# Altium schematic symbol library jlcpcb_2025_04_ferrites_extended_0603.schlib: 833 symbols (part 4 of 4) (continued)
## SZ1608K221TF
designator FB?  Impedance @ Frequency: 220Ω@100MHz
Ferrite, 220Ω@100MHz, ±25%, 450mΩ, 500mA, SMD 0603; Manufacturer: Sunlord; Manufacturer Part Number: SZ1608K221TF; Package Size: 0603; JLCPCB Basic Part: No; JLCPCB Part Number: C96988; Supplier 1: LCSC; Category: Ferrite Beads; Supplier Part Number 1: C96988; Tolerance: ±25%; Rated Current: 500mA; DC Resistance: 450mΩ; RoHS: Yes; ComponentLink1Description: Datasheet; ComponentLink1URL: https://wmsc.lcsc.com/wmsc/upload/file/pdf/v2/lcsc/2310301641_Sunlord-SZ1608K221TF_C96988.pdf; ComponentLink2Description: JLCPCB Part URL; ComponentLink2URL: https://jlcpcb.com/partdetail/C96988; ComponentLink3Description: LCSC Part URL; ComponentLink3URL: https://lcsc.com/product-detail/Ferrite-Beads_Sunlord-Sunlord-SZ1608K221TF_C96988.html
footprint FB-0603 (0603 (1608M) Ferrite)
pins: 1, 2

## SZ1608K222TF
designator FB?  Impedance @ Frequency: 2.2kΩ@100MHz
Ferrite, 2.2kΩ@100MHz, ±25%, 1Ω, 200mA, SMD 0603; Manufacturer: Sunlord; Manufacturer Part Number: SZ1608K222TF; Package Size: 0603; JLCPCB Basic Part: No; JLCPCB Part Number: C370562; Supplier 1: LCSC; Category: Ferrite Beads; Supplier Part Number 1: C370562; Tolerance: ±25%; Rated Current: 200mA; DC Resistance: 1Ω; RoHS: Yes; ComponentLink1Description: Datasheet; ComponentLink1URL: https://wmsc.lcsc.com/wmsc/upload/file/pdf/v2/lcsc/2310301641_Sunlord-SZ1608K222TF_C370562.pdf; ComponentLink2Description: JLCPCB Part URL; ComponentLink2URL: https://jlcpcb.com/partdetail/C370562; ComponentLink3Description: LCSC Part URL; ComponentLink3URL: https://lcsc.com/product-detail/Ferrite-Beads_Sunlord-Sunlord-SZ1608K222TF_C370562.html
footprint FB-0603 (0603 (1608M) Ferrite)
pins: 1, 2

## SZ1608K252CTF
designator FB?  Impedance @ Frequency: 2.5kΩ@100MHz
Ferrite, 2.5kΩ@100MHz, ±25%, 1.2Ω, SMD 0603; Manufacturer: Sunlord; Manufacturer Part Number: SZ1608K252CTF; Package Size: 0603; JLCPCB Basic Part: No; JLCPCB Part Number: C316340; Supplier 1: LCSC; Category: Ferrite Beads; Supplier Part Number 1: C316340; Tolerance: ±25%; DC Resistance: 1.2Ω; RoHS: Yes; ComponentLink1Description: Datasheet; ComponentLink1URL: https://wmsc.lcsc.com/wmsc/upload/file/pdf/v2/lcsc/2310301641_Sunlord-SZ1608K252CTF_C316340.pdf; ComponentLink2Description: JLCPCB Part URL; ComponentLink2URL: https://jlcpcb.com/partdetail/C316340; ComponentLink3Description: LCSC Part URL; ComponentLink3URL: https://lcsc.com/product-detail/Ferrite-Beads_Sunlord-Sunlord-SZ1608K252CTF_C316340.html
pins: 1, 2

## SZ1608K252TF
designator FB?  Impedance @ Frequency: 2.5kΩ@100MHz
Ferrite, 2.5kΩ@100MHz, ±25%, 1.2Ω, 200mA, SMD 0603; Manufacturer: Sunlord; Manufacturer Part Number: SZ1608K252TF; Package Size: 0603; JLCPCB Basic Part: No; JLCPCB Part Number: C96989; Supplier 1: LCSC; Category: Ferrite Beads; Supplier Part Number 1: C96989; Tolerance: ±25%; Rated Current: 200mA; DC Resistance: 1.2Ω; RoHS: Yes; ComponentLink1Description: Datasheet; ComponentLink1URL: https://wmsc.lcsc.com/wmsc/upload/file/pdf/v2/lcsc/2310301641_Sunlord-SZ1608K252TF_C96989.pdf; ComponentLink2Description: JLCPCB Part URL; ComponentLink2URL: https://jlcpcb.com/partdetail/C96989; ComponentLink3Description: LCSC Part URL; ComponentLink3URL: https://lcsc.com/product-detail/Ferrite-Beads_Sunlord-Sunlord-SZ1608K252TF_C96989.html
footprint FB-0603 (0603 (1608M) Ferrite)
pins: 1, 2

## SZ1608K272TF
designator FB?  Impedance @ Frequency: 2.7kΩ@100MHz
Ferrite, 2.7kΩ@100MHz, ±25%, 1.4Ω, 200mA, SMD 0603; Manufacturer: Sunlord; Manufacturer Part Number: SZ1608K272TF; Package Size: 0603; JLCPCB Basic Part: No; JLCPCB Part Number: C370563; Supplier 1: LCSC; Category: Ferrite Beads; Supplier Part Number 1: C370563; Tolerance: ±25%; Rated Current: 200mA; DC Resistance: 1.4Ω; RoHS: Yes; ComponentLink1Description: Datasheet; ComponentLink1URL: https://wmsc.lcsc.com/wmsc/upload/file/pdf/v2/lcsc/2310301641_Sunlord-SZ1608K272TF_C370563.pdf; ComponentLink2Description: JLCPCB Part URL; ComponentLink2URL: https://jlcpcb.com/partdetail/C370563; ComponentLink3Description: LCSC Part URL; ComponentLink3URL: https://lcsc.com/product-detail/Ferrite-Beads_Sunlord-Sunlord-SZ1608K272TF_C370563.html
footprint FB-0603 (0603 (1608M) Ferrite)
pins: 1, 2

## SZ1608K331TF
designator FB?  Impedance @ Frequency: 330Ω@100MHz
Ferrite, 330Ω@100MHz, ±25%, 500mΩ, 500mA, SMD 0603; Manufacturer: Sunlord; Manufacturer Part Number: SZ1608K331TF; Package Size: 0603; JLCPCB Basic Part: No; JLCPCB Part Number: C96990; Supplier 1: LCSC; Category: Ferrite Beads; Supplier Part Number 1: C96990; Tolerance: ±25%; Rated Current: 500mA; DC Resistance: 500mΩ; RoHS: Yes; ComponentLink1Description: Datasheet; ComponentLink1URL: https://wmsc.lcsc.com/wmsc/upload/file/pdf/v2/lcsc/2310301641_Sunlord-SZ1608K331TF_C96990.pdf; ComponentLink2Description: JLCPCB Part URL; ComponentLink2URL: https://jlcpcb.com/partdetail/C96990; ComponentLink3Description: LCSC Part URL; ComponentLink3URL: https://lcsc.com/product-detail/Ferrite-Beads_Sunlord-Sunlord-SZ1608K331TF_C96990.html
footprint FB-0603 (0603 (1608M) Ferrite)
pins: 1, 2

## SZ1608K421TF
designator FB?  Impedance @ Frequency: 420Ω@100MHz
Ferrite, 420Ω@100MHz, ±25%, 550mΩ, 400mA, SMD 0603; Manufacturer: Sunlord; Manufacturer Part Number: SZ1608K421TF; Package Size: 0603; JLCPCB Basic Part: No; JLCPCB Part Number: C370564; Supplier 1: LCSC; Category: Ferrite Beads; Supplier Part Number 1: C370564; Tolerance: ±25%; Rated Current: 400mA; DC Resistance: 550mΩ; RoHS: Yes; ComponentLink1Description: Datasheet; ComponentLink1URL: https://wmsc.lcsc.com/wmsc/upload/file/pdf/v2/lcsc/2310301641_Sunlord-SZ1608K421TF_C370564.pdf; ComponentLink2Description: JLCPCB Part URL; ComponentLink2URL: https://jlcpcb.com/partdetail/C370564; ComponentLink3Description: LCSC Part URL; ComponentLink3URL: https://lcsc.com/product-detail/Ferrite-Beads_Sunlord-Sunlord-SZ1608K421TF_C370564.html
footprint FB-0603 (0603 (1608M) Ferrite)
pins: 1, 2

## SZ1608K601CTF
designator FB?  Impedance @ Frequency: 600Ω@100MHz
Ferrite, 600Ω@100MHz, ±25%, 600mΩ, SMD 0603; Manufacturer: Sunlord; Manufacturer Part Number: SZ1608K601CTF; Package Size: 0603; JLCPCB Basic Part: No; JLCPCB Part Number: C316339; Supplier 1: LCSC; Category: Ferrite Beads; Supplier Part Number 1: C316339; Tolerance: ±25%; DC Resistance: 600mΩ; RoHS: Yes; ComponentLink1Description: Datasheet; ComponentLink1URL: https://wmsc.lcsc.com/wmsc/upload/file/pdf/v2/lcsc/2310301641_Sunlord-SZ1608K601CTF_C316339.pdf; ComponentLink2Description: JLCPCB Part URL; ComponentLink2URL: https://jlcpcb.com/partdetail/C316339; ComponentLink3Description: LCSC Part URL; ComponentLink3URL: https://lcsc.com/product-detail/Ferrite-Beads_Sunlord-Sunlord-SZ1608K601CTF_C316339.html
pins: 1, 2

## SZ1608K601TF
designator FB?  Impedance @ Frequency: 600Ω@100MHz
Ferrite, 600Ω@100MHz, ±25%, 600mΩ, 200mA, SMD 0603; Manufacturer: Sunlord; Manufacturer Part Number: SZ1608K601TF; Package Size: 0603; JLCPCB Basic Part: No; JLCPCB Part Number: C96991; Supplier 1: LCSC; Category: Ferrite Beads; Supplier Part Number 1: C96991; Tolerance: ±25%; Rated Current: 200mA; DC Resistance: 600mΩ; RoHS: Yes; ComponentLink1Description: Datasheet; ComponentLink1URL: https://wmsc.lcsc.com/wmsc/upload/file/pdf/v2/lcsc/2310301641_Sunlord-SZ1608K601TF_C96991.pdf; ComponentLink2Description: JLCPCB Part URL; ComponentLink2URL: https://jlcpcb.com/partdetail/C96991; ComponentLink3Description: LCSC Part URL; ComponentLink3URL: https://lcsc.com/product-detail/Ferrite-Beads_Sunlord-Sunlord-SZ1608K601TF_C96991.html
footprint FB-0603 (0603 (1608M) Ferrite)
pins: 1, 2

## UPB160805T-121Y-N
designator FB?  Impedance @ Frequency: 120Ω@100MHz
Ferrite, 120Ω@100MHz, ±25%, 0.025Ω, 3000mA, SMD 0603; Manufacturer: Chilisin Elec; Manufacturer Part Number: UPB160805T-121Y-N; Package Size: 0603; JLCPCB Basic Part: No; JLCPCB Part Number: C285595; Supplier 1: LCSC; Category: Ferrite Beads; Supplier Part Number 1: C285595; Tolerance: ±25%; Rated Current: 3000mA; DC Resistance: 0.025Ω; RoHS: Yes; ComponentLink1Description: Datasheet; ComponentLink1URL: https://wmsc.lcsc.com/wmsc/upload/file/pdf/v2/lcsc/1810311831_Chilisin-Elec-UPB160805T-121Y-N_C285595.pdf; ComponentLink2Description: JLCPCB Part URL; ComponentLink2URL: https://jlcpcb.com/partdetail/C285595; ComponentLink3Description: LCSC Part URL; ComponentLink3URL: https://lcsc.com/product-detail/Ferrite-Beads_Chilisin-Elec-Chilisin-Elec-UPB160805T-121Y-N_C285595.html
footprint FB-0603 (0603 (1608M) Ferrite)
pins: 1, 2

## UPB160805T-260Y-N
designator FB?  Impedance @ Frequency: 26Ω@100MHz
Ferrite, 26Ω@100MHz, ±25%, 0.007Ω, 6000mA, SMD 0603; Manufacturer: Chilisin Elec; Manufacturer Part Number: UPB160805T-260Y-N; Package Size: 0603; JLCPCB Basic Part: No; JLCPCB Part Number: C285594; Supplier 1: LCSC; Category: Ferrite Beads; Supplier Part Number 1: C285594; Tolerance: ±25%; Rated Current: 6000mA; DC Resistance: 0.007Ω; RoHS: Yes; ComponentLink1Description: Datasheet; ComponentLink1URL: https://wmsc.lcsc.com/wmsc/upload/file/pdf/v2/lcsc/2304140030_Chilisin-Elec-UPB160805T-260Y-N_C285594.pdf; ComponentLink2Description: JLCPCB Part URL; ComponentLink2URL: https://jlcpcb.com/partdetail/C285594; ComponentLink3Description: LCSC Part URL; ComponentLink3URL: https://lcsc.com/product-detail/Ferrite-Beads_Chilisin-Elec-Chilisin-Elec-UPB160805T-260Y-N_C285594.html
footprint FB-0603 (0603 (1608M) Ferrite)
pins: 1, 2

## UPB160808T-121Y-N
designator FB?  Impedance @ Frequency: 120Ω@100MHz
Ferrite, 120Ω@100MHz, ±25%, 0.03Ω, 3000mA, SMD 0603; Manufacturer: Chilisin Elec; Manufacturer Part Number: UPB160808T-121Y-N; Package Size: 0603; JLCPCB Basic Part: No; JLCPCB Part Number: C280697; Supplier 1: LCSC; Category: Ferrite Beads; Supplier Part Number 1: C280697; Tolerance: ±25%; Rated Current: 3000mA; DC Resistance: 0.03Ω; RoHS: Yes; ComponentLink1Description: Datasheet; ComponentLink1URL: https://wmsc.lcsc.com/wmsc/upload/file/pdf/v2/lcsc/2304140030_Chilisin-Elec-UPB160808T-121Y-N_C280697.pdf; ComponentLink2Description: JLCPCB Part URL; ComponentLink2URL: https://jlcpcb.com/partdetail/C280697; ComponentLink3Description: LCSC Part URL; ComponentLink3URL: https://lcsc.com/product-detail/Ferrite-Beads_Chilisin-Elec-Chilisin-Elec-UPB160808T-121Y-N_C280697.html
footprint FB-0603 (0603 (1608M) Ferrite)
pins: 1, 2

## UPB160808T-221Y-N
designator FB?  Impedance @ Frequency: 220Ω@100MHz
Ferrite, 220Ω@100MHz, ±25%, 0.04Ω, 2500mA, SMD 0603; Manufacturer: Chilisin Elec; Manufacturer Part Number: UPB160808T-221Y-N; Package Size: 0603; JLCPCB Basic Part: No; JLCPCB Part Number: C280698; Supplier 1: LCSC; Category: Ferrite Beads; Supplier Part Number 1: C280698; Tolerance: ±25%; Rated Current: 2500mA; DC Resistance: 0.04Ω; RoHS: Yes; ComponentLink1Description: Datasheet; ComponentLink1URL: https://wmsc.lcsc.com/wmsc/upload/file/pdf/v2/lcsc/1912111437_Chilisin-Elec-UPB160808T-221Y-N_C280698.pdf; ComponentLink2Description: JLCPCB Part URL; ComponentLink2URL: https://jlcpcb.com/partdetail/C280698; ComponentLink3Description: LCSC Part URL; ComponentLink3URL: https://lcsc.com/product-detail/Ferrite-Beads_Chilisin-Elec-Chilisin-Elec-UPB160808T-221Y-N_C280698.html
footprint FB-0603 (0603 (1608M) Ferrite)
pins: 1, 2

## UPB160808T-300Y-N
designator FB?  Impedance @ Frequency: 30Ω@100MHz
Ferrite, 30Ω@100MHz, ±25%, 0.015Ω, 4500mA, SMD 0603; Manufacturer: Chilisin Elec; Manufacturer Part Number: UPB160808T-300Y-N; Package Size: 0603; JLCPCB Basic Part: No; JLCPCB Part Number: C285593; Supplier 1: LCSC; Category: Ferrite Beads; Supplier Part Number 1: C285593; Tolerance: ±25%; Rated Current: 4500mA; DC Resistance: 0.015Ω; RoHS: Yes; ComponentLink1Description: Datasheet; ComponentLink1URL: https://wmsc.lcsc.com/wmsc/upload/file/pdf/v2/lcsc/2304140030_Chilisin-Elec-UPB160808T-300Y-N_C285593.pdf; ComponentLink2Description: JLCPCB Part URL; ComponentLink2URL: https://jlcpcb.com/partdetail/C285593; ComponentLink3Description: LCSC Part URL; ComponentLink3URL: https://lcsc.com/product-detail/Ferrite-Beads_Chilisin-Elec-Chilisin-Elec-UPB160808T-300Y-N_C285593.html
footprint FB-0603 (0603 (1608M) Ferrite)
pins: 1, 2

## UPB160808T-600Y-N
designator FB?  Impedance @ Frequency: 60Ω@100MHz
Ferrite, 60Ω@100MHz, ±25%, 0.02Ω, 4000mA, SMD 0603; Manufacturer: Chilisin Elec; Manufacturer Part Number: UPB160808T-600Y-N; Package Size: 0603; JLCPCB Basic Part: No; JLCPCB Part Number: C285592; Supplier 1: LCSC; Category: Ferrite Beads; Supplier Part Number 1: C285592; Tolerance: ±25%; Rated Current: 4000mA; DC Resistance: 0.02Ω; RoHS: Yes; ComponentLink1Description: Datasheet; ComponentLink1URL: https://wmsc.lcsc.com/wmsc/upload/file/pdf/v2/lcsc/2304140030_Chilisin-Elec-UPB160808T-600Y-N_C285592.pdf; ComponentLink2Description: JLCPCB Part URL; ComponentLink2URL: https://jlcpcb.com/partdetail/C285592; ComponentLink3Description: LCSC Part URL; ComponentLink3URL: https://lcsc.com/product-detail/Ferrite-Beads_Chilisin-Elec-Chilisin-Elec-UPB160808T-600Y-N_C285592.html
footprint FB-0603 (0603 (1608M) Ferrite)
pins: 1, 2

## UPZ1608E101-3R0TF
designator FB?  Impedance @ Frequency: 100Ω@100MHz
Ferrite, 100Ω@100MHz, ±25%, 30mΩ, 3A, SMD 0603; Manufacturer: Sunlord; Manufacturer Part Number: UPZ1608E101-3R0TF; Package Size: 0603; JLCPCB Basic Part: No; JLCPCB Part Number: C96995; Supplier 1: LCSC; Category: Ferrite Beads; Supplier Part Number 1: C96995; Tolerance: ±25%; Rated Current: 3A; DC Resistance: 30mΩ; RoHS: Yes; ComponentLink1Description: Datasheet; ComponentLink1URL: https://wmsc.lcsc.com/wmsc/upload/file/pdf/v2/lcsc/2310301641_Sunlord-UPZ1608E101-3R0TF_C96995.pdf; ComponentLink2Description: JLCPCB Part URL; ComponentLink2URL: https://jlcpcb.com/partdetail/C96995; ComponentLink3Description: LCSC Part URL; ComponentLink3URL: https://lcsc.com/product-detail/Ferrite-Beads_Sunlord-Sunlord-UPZ1608E101-3R0TF_C96995.html
footprint FB-0603 (0603 (1608M) Ferrite)
pins: 1, 2

## UPZ1608E121-3R0TF
designator FB?  Impedance @ Frequency: 120Ω@100MHz
Ferrite, 120Ω@100MHz, ±25%, 35mΩ, 3A, SMD 0603; Manufacturer: Sunlord; Manufacturer Part Number: UPZ1608E121-3R0TF; Package Size: 0603; JLCPCB Basic Part: No; JLCPCB Part Number: C279682; Supplier 1: LCSC; Category: Ferrite Beads; Supplier Part Number 1: C279682; Tolerance: ±25%; Rated Current: 3A; DC Resistance: 35mΩ; RoHS: Yes; ComponentLink1Description: Datasheet; ComponentLink1URL: https://wmsc.lcsc.com/wmsc/upload/file/pdf/v2/lcsc/2310301641_Sunlord-UPZ1608E121-3R0TF_C279682.pdf; ComponentLink2Description: JLCPCB Part URL; ComponentLink2URL: https://jlcpcb.com/partdetail/C279682; ComponentLink3Description: LCSC Part URL; ComponentLink3URL: https://lcsc.com/product-detail/Ferrite-Beads_Sunlord-Sunlord-UPZ1608E121-3R0TF_C279682.html
footprint FB-0603 (0603 (1608M) Ferrite)
pins: 1, 2

## UPZ1608E181-2R2TF
designator FB?  Impedance @ Frequency: 180Ω@100MHz
Ferrite, 180Ω@100MHz, ±25%, 50mΩ, 2.2A, SMD 0603; Manufacturer: Sunlord; Manufacturer Part Number: UPZ1608E181-2R2TF; Package Size: 0603; JLCPCB Basic Part: No; JLCPCB Part Number: C96996; Supplier 1: LCSC; Category: Ferrite Beads; Supplier Part Number 1: C96996; Tolerance: ±25%; Rated Current: 2.2A; DC Resistance: 50mΩ; RoHS: Yes; ComponentLink1Description: Datasheet; ComponentLink1URL: https://wmsc.lcsc.com/wmsc/upload/file/pdf/v2/lcsc/2310301641_Sunlord-UPZ1608E181-2R2TF_C96996.pdf; ComponentLink2Description: JLCPCB Part URL; ComponentLink2URL: https://jlcpcb.com/partdetail/C96996; ComponentLink3Description: LCSC Part URL; ComponentLink3URL: https://lcsc.com/product-detail/Ferrite-Beads_Sunlord-Sunlord-UPZ1608E181-2R2TF_C96996.html
footprint FB-0603 (0603 (1608M) Ferrite)
pins: 1, 2

## UPZ1608E221-2R0TF
designator FB?  Impedance @ Frequency: 220Ω@100MHz
Ferrite, 220Ω@100MHz, ±25%, 2A, SMD 0603; Manufacturer: Sunlord; Manufacturer Part Number: UPZ1608E221-2R0TF; Package Size: 0603; JLCPCB Basic Part: No; JLCPCB Part Number: C98304; Supplier 1: LCSC; Category: Ferrite Beads; Supplier Part Number 1: C98304; Tolerance: ±25%; Rated Current: 2A; RoHS: Yes; ComponentLink1Description: Datasheet; ComponentLink1URL: https://wmsc.lcsc.com/wmsc/upload/file/pdf/v2/lcsc/2310301641_Sunlord-UPZ1608E221-2R0TF_C98304.pdf; ComponentLink2Description: JLCPCB Part URL; ComponentLink2URL: https://jlcpcb.com/partdetail/C98304; ComponentLink3Description: LCSC Part URL; ComponentLink3URL: https://lcsc.com/product-detail/Ferrite-Beads_Sunlord-Sunlord-UPZ1608E221-2R0TF_C98304.html
pins: 1, 2

## UPZ1608E221-2R2TF
designator FB?  Impedance @ Frequency: 220Ω@100MHz
Ferrite, 220Ω@100MHz, ±25%, 50mΩ, 2.2A, SMD 0603; Manufacturer: Sunlord; Manufacturer Part Number: UPZ1608E221-2R2TF; Package Size: 0603; JLCPCB Basic Part: No; JLCPCB Part Number: C96997; Supplier 1: LCSC; Category: Ferrite Beads; Supplier Part Number 1: C96997; Tolerance: ±25%; Rated Current: 2.2A; DC Resistance: 50mΩ; RoHS: Yes; ComponentLink1Description: Datasheet; ComponentLink1URL: https://wmsc.lcsc.com/wmsc/upload/file/pdf/v2/lcsc/2310301641_Sunlord-UPZ1608E221-2R2TF_C96997.pdf; ComponentLink2Description: JLCPCB Part URL; ComponentLink2URL: https://jlcpcb.com/partdetail/C96997; ComponentLink3Description: LCSC Part URL; ComponentLink3URL: https://lcsc.com/product-detail/Ferrite-Beads_Sunlord-Sunlord-UPZ1608E221-2R2TF_C96997.html
footprint FB-0603 (0603 (1608M) Ferrite)
pins: 1, 2

## UPZ1608E260-6R0TF
designator FB?  Impedance @ Frequency: 26Ω@100MHz
Ferrite, 26Ω@100MHz, ±25%, 6A, SMD 0603; Manufacturer: Sunlord; Manufacturer Part Number: UPZ1608E260-6R0TF; Package Size: 0603; JLCPCB Basic Part: No; JLCPCB Part Number: C370569; Supplier 1: LCSC; Category: Ferrite Beads; Supplier Part Number 1: C370569; Tolerance: ±25%; Rated Current: 6A; RoHS: Yes; ComponentLink1Description: Datasheet; ComponentLink1URL: https://wmsc.lcsc.com/wmsc/upload/file/pdf/v2/lcsc/2310301641_Sunlord-UPZ1608E260-6R0TF_C370569.pdf; ComponentLink2Description: JLCPCB Part URL; ComponentLink2URL: https://jlcpcb.com/partdetail/C370569; ComponentLink3Description: LCSC Part URL; ComponentLink3URL: https://lcsc.com/product-detail/Ferrite-Beads_Sunlord-Sunlord-UPZ1608E260-6R0TF_C370569.html
pins: 1, 2

## UPZ1608E300-5R0TF
designator FB?  Impedance @ Frequency: 30Ω@100MHz
Ferrite, 30Ω@100MHz, ±25%, 10mΩ, 5A, SMD 0603; Manufacturer: Sunlord; Manufacturer Part Number: UPZ1608E300-5R0TF; Package Size: 0603; JLCPCB Basic Part: No; JLCPCB Part Number: C98303; Supplier 1: LCSC; Category: Ferrite Beads; Supplier Part Number 1: C98303; Tolerance: ±25%; Rated Current: 5A; DC Resistance: 10mΩ; RoHS: Yes; ComponentLink1Description: Datasheet; ComponentLink1URL: https://wmsc.lcsc.com/wmsc/upload/file/pdf/v2/lcsc/2310301641_Sunlord-UPZ1608E300-5R0TF_C98303.pdf; ComponentLink2Description: JLCPCB Part URL; ComponentLink2URL: https://jlcpcb.com/partdetail/C98303; ComponentLink3Description: LCSC Part URL; ComponentLink3URL: https://lcsc.com/product-detail/Ferrite-Beads_Sunlord-Sunlord-UPZ1608E300-5R0TF_C98303.html
footprint FB-0603 (0603 (1608M) Ferrite)
pins: 1, 2

## UPZ1608E331-1R7TF
designator FB?  Impedance @ Frequency: 330Ω@100MHz
Ferrite, 330Ω@100MHz, ±25%, 80mΩ, 1.7A, SMD 0603; Manufacturer: Sunlord; Manufacturer Part Number: UPZ1608E331-1R7TF; Package Size: 0603; JLCPCB Basic Part: No; JLCPCB Part Number: C96998; Supplier 1: LCSC; Category: Ferrite Beads; Supplier Part Number 1: C96998; Tolerance: ±25%; Rated Current: 1.7A; DC Resistance: 80mΩ; RoHS: Yes; ComponentLink1Description: Datasheet; ComponentLink1URL: https://wmsc.lcsc.com/wmsc/upload/file/pdf/v2/lcsc/2310301641_Sunlord-UPZ1608E331-1R7TF_C96998.pdf; ComponentLink2Description: JLCPCB Part URL; ComponentLink2URL: https://jlcpcb.com/partdetail/C96998; ComponentLink3Description: LCSC Part URL; ComponentLink3URL: https://lcsc.com/product-detail/Ferrite-Beads_Sunlord-Sunlord-UPZ1608E331-1R7TF_C96998.html
footprint FB-0603 (0603 (1608M) Ferrite)
pins: 1, 2

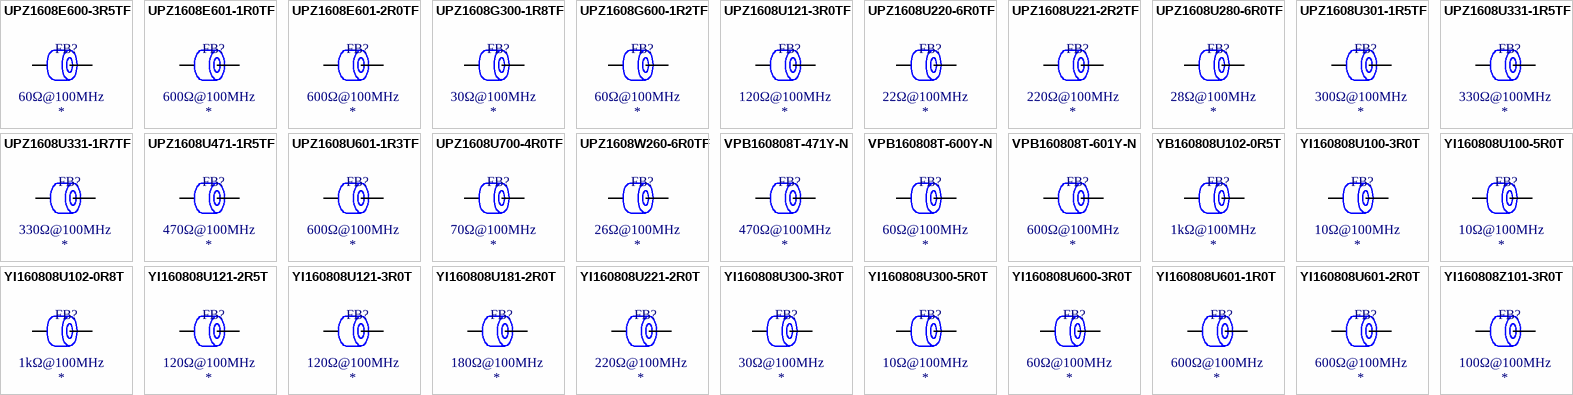
[diagram p20: symbols UPZ1608E600-3R5TF to YI160808Z101-3R0T]

## UPZ1608E600-3R5TF
designator FB?  Impedance @ Frequency: 60Ω@100MHz
Ferrite, 60Ω@100MHz, ±25%, 20mΩ, 3.5A, SMD 0603; Manufacturer: Sunlord; Manufacturer Part Number: UPZ1608E600-3R5TF; Package Size: 0603; JLCPCB Basic Part: No; JLCPCB Part Number: C316334; Supplier 1: LCSC; Category: Ferrite Beads; Supplier Part Number 1: C316334; Tolerance: ±25%; Rated Current: 3.5A; DC Resistance: 20mΩ; RoHS: Yes; ComponentLink1Description: Datasheet; ComponentLink1URL: https://wmsc.lcsc.com/wmsc/upload/file/pdf/v2/lcsc/2310301641_Sunlord-UPZ1608E600-3R5TF_C316334.pdf; ComponentLink2Description: JLCPCB Part URL; ComponentLink2URL: https://jlcpcb.com/partdetail/C316334; ComponentLink3Description: LCSC Part URL; ComponentLink3URL: https://lcsc.com/product-detail/Ferrite-Beads_Sunlord-Sunlord-UPZ1608E600-3R5TF_C316334.html
footprint FB-0603 (0603 (1608M) Ferrite)
pins: 1, 2

## UPZ1608E601-1R0TF
designator FB?  Impedance @ Frequency: 600Ω@100MHz
Ferrite, 600Ω@100MHz, ±25%, 150mΩ, 1A, SMD 0603; Manufacturer: Sunlord; Manufacturer Part Number: UPZ1608E601-1R0TF; Package Size: 0603; JLCPCB Basic Part: No; JLCPCB Part Number: C133527; Supplier 1: LCSC; Category: Ferrite Beads; Supplier Part Number 1: C133527; Tolerance: ±25%; Rated Current: 1A; DC Resistance: 150mΩ; RoHS: Yes; ComponentLink1Description: Datasheet; ComponentLink1URL: https://wmsc.lcsc.com/wmsc/upload/file/pdf/v2/lcsc/2310301641_Sunlord-UPZ1608E601-1R0TF_C133527.pdf; ComponentLink2Description: JLCPCB Part URL; ComponentLink2URL: https://jlcpcb.com/partdetail/C133527; ComponentLink3Description: LCSC Part URL; ComponentLink3URL: https://lcsc.com/product-detail/Ferrite-Beads_Sunlord-Sunlord-UPZ1608E601-1R0TF_C133527.html
footprint FB-0603 (0603 (1608M) Ferrite)
pins: 1, 2

## UPZ1608E601-2R0TF
designator FB?  Impedance @ Frequency: 600Ω@100MHz
Ferrite, 600Ω@100MHz, ±25%, 2A, SMD 0603; Manufacturer: Sunlord; Manufacturer Part Number: UPZ1608E601-2R0TF; Package Size: 0603; JLCPCB Basic Part: No; JLCPCB Part Number: C370570; Supplier 1: LCSC; Category: Ferrite Beads; Supplier Part Number 1: C370570; Tolerance: ±25%; Rated Current: 2A; RoHS: Yes; ComponentLink1Description: Datasheet; ComponentLink1URL: https://wmsc.lcsc.com/wmsc/upload/file/pdf/v2/lcsc/2310301641_Sunlord-UPZ1608E601-2R0TF_C370570.pdf; ComponentLink2Description: JLCPCB Part URL; ComponentLink2URL: https://jlcpcb.com/partdetail/C370570; ComponentLink3Description: LCSC Part URL; ComponentLink3URL: https://lcsc.com/product-detail/Ferrite-Beads_Sunlord-Sunlord-UPZ1608E601-2R0TF_C370570.html
pins: 1, 2

## UPZ1608G300-1R8TF
designator FB?  Impedance @ Frequency: 30Ω@100MHz
Ferrite, 30Ω@100MHz, ±25%, 60mΩ, 1.8A, SMD 0603; Manufacturer: Sunlord; Manufacturer Part Number: UPZ1608G300-1R8TF; Package Size: 0603; JLCPCB Basic Part: No; JLCPCB Part Number: C919159; Supplier 1: LCSC; Category: Ferrite Beads; Supplier Part Number 1: C919159; Tolerance: ±25%; Rated Current: 1.8A; DC Resistance: 60mΩ; RoHS: Yes; ComponentLink1Description: Datasheet; ComponentLink1URL: https://wmsc.lcsc.com/wmsc/upload/file/pdf/v2/lcsc/2310301641_Sunlord-UPZ1608G300-1R8TF_C919159.pdf; ComponentLink2Description: JLCPCB Part URL; ComponentLink2URL: https://jlcpcb.com/partdetail/C919159; ComponentLink3Description: LCSC Part URL; ComponentLink3URL: https://lcsc.com/product-detail/Ferrite-Beads_Sunlord-Sunlord-UPZ1608G300-1R8TF_C919159.html
footprint FB-0603 (0603 (1608M) Ferrite)
pins: 1, 2
